# Altium footprint library 封装库.PcbLib: 755 footprints (part 38 of 48)
Each footprint in its own frame and in the unit in brackets; x right, y up, seen from the top. Pads: shape width x height; smd on the part's side, far side on the other; paste and mask are expansions set on the pad; w line width, h text height; cw(c..) or ccw(c..) is an arc to the next point about the centre after c.
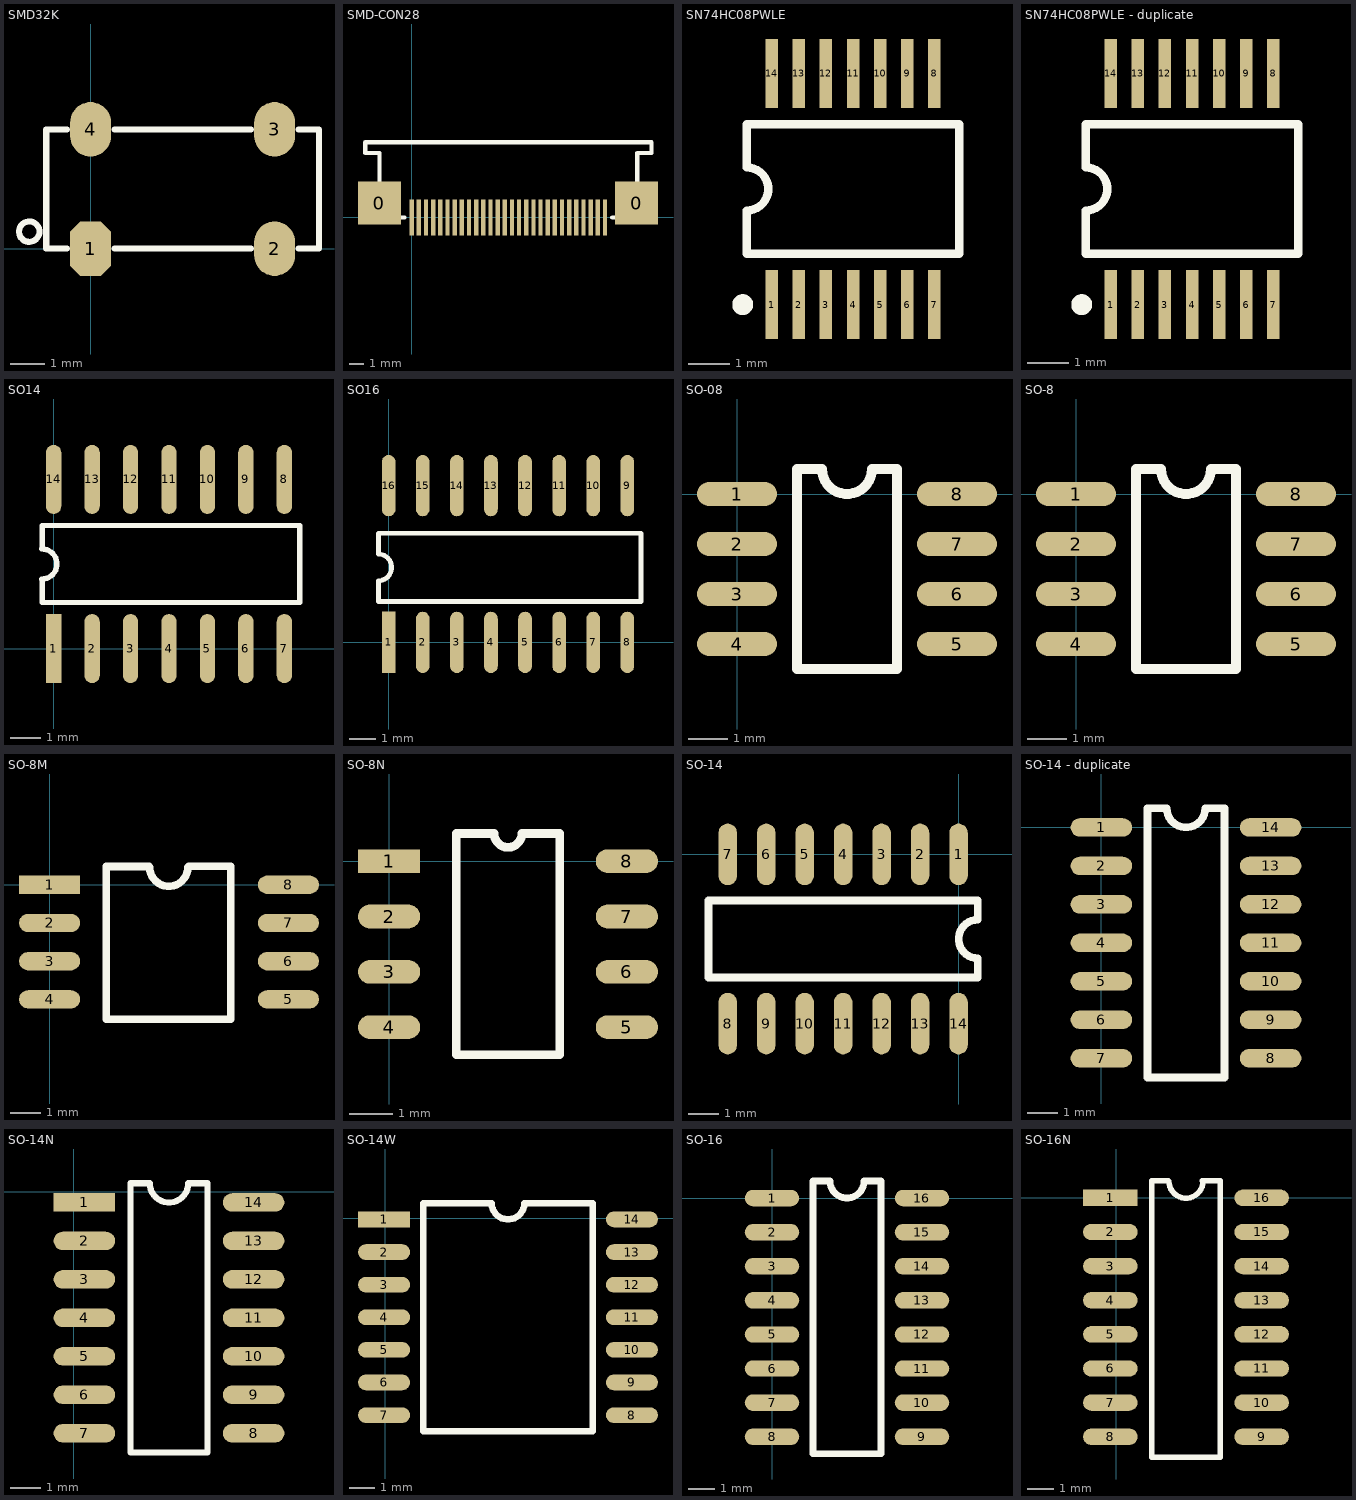
[diagram p37: the footprints below, top view; thin cyan lines are the x and y axes]

## SMD32K [mm]
pads (4):
  oct 1.2x1.6 smd: 1(-0.01,0)
  oval 1.2x1.6 smd: 2(5.39,0) 3(5.39,3.5) 4(-0.01,3.5)
Top Overlay:
  circle w0.178: c-1.81,0.5 r0.3
  lines w0.178: -0.71,0 -1.31,0 -1.31,3.5 -0.71,3.5 ; 0.69,0 4.69,0 ; 0.69,3.5 4.69,3.5 ; 6.09,0 6.69,0 6.69,3.5 6.09,3.5

## SMD-CON28 [mm]
pads (30):
  rect 3x3 smd: 0(-2.25,1) 0(15.7,1)
  rect 0.3x2.54 smd: 1(0,0) 2(0.5,0) 3(1,0) 4(1.5,0) 5(2,0) 6(2.5,0) 7(3,0) 8(3.5,0) 9(4,0) 10(4.5,0) 11(5,0) 12(5.5,0) 13(6,0) 14(6.5,0) 15(7,0) 16(7.5,0) 17(8,0) 18(8.5,0) 19(9,0) 20(9.5,0) 21(10,0) 22(10.5,0) 23(11,0) 24(11.5,0) 25(12,0) 26(12.5,0) 27(13,0) 28(13.5,0)
Top Overlay:
  lines w0.305: -0.5,0 -2.25,0 -2.25,4.5 -3.25,4.5 -3.25,5.25 -2.25,5.25 5.75,5.25 15.75,5.25 16.75,5.25 16.75,4.5 15.75,4.5 15.75,0 14,0 ; 2.25,5.25 9.5,5.25

## SN74HC08PWLE [mm]
pads (14):
  rect 0.3x1.65 smd: 1(-745.799,-810.4) 2(-745.149,-810.4) 3(-744.499,-810.4) 4(-743.849,-810.4) 5(-743.199,-810.4) 6(-742.549,-810.4) 7(-741.899,-810.4) 8(-741.899,-804.85) 9(-742.549,-804.85) 10(-743.199,-804.85) 11(-743.849,-804.85) 12(-744.499,-804.85) 13(-745.149,-804.85) 14(-745.799,-804.85)
Top Overlay:
  circle w0.25: c-746.499,-810.4 r0.125
  lines w0.2: -746.399,-809.175 -741.299,-809.175 -741.299,-806.075 -746.399,-806.075 -746.399,-807.108 cw(c-746.399,-807.625) -746.399,-808.142 -746.399,-809.175

## SN74HC08PWLE - duplicate [mm]
pads (14):
  rect 0.3x1.65 smd: 1(-745.799,-810.4) 2(-745.149,-810.4) 3(-744.499,-810.4) 4(-743.849,-810.4) 5(-743.199,-810.4) 6(-742.549,-810.4) 7(-741.899,-810.4) 8(-741.899,-804.85) 9(-742.549,-804.85) 10(-743.199,-804.85) 11(-743.849,-804.85) 12(-744.499,-804.85) 13(-745.149,-804.85) 14(-745.799,-804.85)
Top Overlay:
  circle w0.25: c-746.499,-810.4 r0.125
  lines w0.2: -746.399,-809.175 -741.299,-809.175 -741.299,-806.075 -746.399,-806.075 -746.399,-807.108 cw(c-746.399,-807.625) -746.399,-808.142 -746.399,-809.175

## SO14 [mil]
pads (14):
  rect 20x90 smd: 1(0,0)
  oval 20x90 smd: 2(50,0) 3(100,0) 4(150,0) 5(200,0) 6(250,0) 7(300,0) 8(300,220) 9(250,220) 10(200,220) 11(150,220) 12(100,220) 13(50,220) 14(0,220)
Top Overlay:
  lines w7: -15.35,90.31 ccw(c-15.35,110) -15.35,129.69 ; -15,90 -15,60 170,60 320,60 320,160 170,160 -15,160 -15,130

## SO16 [mil]
pads (16):
  rect 20x90 smd: 1(0,0)
  oval 20x90 smd: 2(50,0) 3(100,0) 4(150,0) 5(200,0) 6(250,0) 7(300,0) 8(350,0) 9(350,230) 10(300,230) 11(250,230) 12(200,230) 13(150,230) 14(100,230) 15(50,230) 16(0,230)
Top Overlay:
  lines w7: -15.35,90.31 ccw(c-15.35,110) -15.35,129.69 ; -15,90 -15,60 170,60 370,60 370,160 170,160 -15,160 -15,130

## SO-08 [mil]
pads (8):
  oval 80x24 smd: 1(0,0) 2(0,-50) 3(0,-100) 4(0,-150) 5(220,-150) 6(220,-100) 7(220,-50) 8(220,0)
Top Overlay:
  lines w10: 60,-175 60,25 85,25 ccw(c110,25) 135,25 160,25 160,-175 60,-175

## SO-8 [mil]
pads (8):
  oval 80x24 smd: 1(0,0) 2(0,-50) 3(0,-100) 4(0,-150) 5(220,-150) 6(220,-100) 7(220,-50) 8(220,0)
Top Overlay:
  lines w10: 60,-175 60,25 85,25 ccw(c110,25) 135,25 160,25 160,-175 60,-175

## SO-8M [mil]
pads (8):
  rect 80x24 smd: 1(0,0)
  oval 80x24 smd: 2(0,-50) 3(0,-100) 4(0,-150) 5(312.6,-150) 6(312.6,-100) 7(312.6,-50) 8(312.6,0)
Top Overlay:
  lines w10: 130.06,23.94 74.39,23.94 74.39,-176.06 237.01,-176.06 ; 131,23 ccw(c156,23) 181,23 ; 182,24 237.01,24 ; 236.01,23 237.01,24 ; 237.01,-176 237.01,24

## SO-8N [mm]
pads (8):
  rect 1.44x0.55 smd: 1(0,0)
  oval 1.44x0.55 smd: 2(0,-1.28) 3(0,-2.56) 4(0,-3.84) 5(5.5,-3.84) 6(5.5,-2.56) 7(5.5,-1.28) 8(5.5,0)
Top Overlay:
  lines w0.2: 1.555,-4.48 1.555,0.64 2.43,0.64 ccw(c2.75,0.64) 3.07,0.64 3.945,0.64 3.945,-4.48 1.555,-4.48

## SO-14 [mil]
pads (14):
  oval 24x80 smd: 1(-0.24,0.12) 2(-50.24,0.12) 3(-100.24,0.12) 4(-150.24,0.12) 5(-200.24,0.12) 6(-250.24,0.12) 7(-300.24,0.12) 8(-300.24,-219.88) 9(-250.24,-219.88) 10(-200.24,-219.88) 11(-150.24,-219.88) 12(-100.24,-219.88) 13(-50.24,-219.88) 14(-0.24,-219.88)
Top Overlay:
  lines w10: -325.24,-159.88 24.76,-159.88 24.76,-134.88 cw(c24.76,-109.88) 24.76,-84.88 24.76,-59.88 -325.24,-59.88 -325.24,-159.88

## SO-14 - duplicate [mil]
pads (14):
  oval 80x24 smd: 1(0,0) 2(0,-50) 3(0,-100) 4(0,-150) 5(0,-200) 6(0,-250) 7(0,-300) 8(220,-300) 9(220,-250) 10(220,-200) 11(220,-150) 12(220,-100) 13(220,-50) 14(220,0)
Top Overlay:
  lines w10: 60,-325 160,-325 160,25 135,25 cw(c110,25) 85,25 60,25 60,-325

## SO-14N [mil]
pads (14):
  rect 80x24 smd: 1(14,-14)
  oval 80x24 smd: 2(14,-64) 3(14,-114) 4(14,-164) 5(14,-214) 6(14,-264) 7(14,-314) 8(234,-314) 9(234,-264) 10(234,-214) 11(234,-164) 12(234,-114) 13(234,-64) 14(234,-14)
Top Overlay:
  lines w8: 74,-339 74,11 99,11 ccw(c124,11) 149,11 174,11 174,-339 74,-339

## SO-14W [mil]
pads (14):
  rect 80x24 smd: 1(-2,-2)
  oval 80x24 smd: 2(-2,-52) 3(-2,-102) 4(-2,-152) 5(-2,-202) 6(-2,-252) 7(-2,-302) 8(378,-302) 9(378,-252) 10(378,-202) 11(378,-152) 12(378,-102) 13(378,-52) 14(378,-2)
Top Overlay:
  lines w10: 58,-327 58,23 163,23 ccw(c188,23) 213,23 318,23 318,-327 58,-327

## SO-16 [mil]
pads (16):
  oval 80x24 smd: 1(0,0) 2(0,-50) 3(0,-100) 4(0,-150) 5(0,-200) 6(0,-250) 7(0,-300) 8(0,-350) 9(220,-350) 10(220,-300) 11(220,-250) 12(220,-200) 13(220,-150) 14(220,-100) 15(220,-50) 16(220,0)
Top Overlay:
  lines w10: 60,-375 60,25 85,25 ccw(c110,25) 135,25 160,25 160,-375 60,-375

## SO-16N [mil]
pads (16):
  rect 80x24 smd: 1(-9,0.1)
  oval 80x24 smd: 2(-9,-49.9) 3(-9,-99.9) 4(-9,-149.9) 5(-9,-199.9) 6(-9,-249.9) 7(-9,-299.9) 8(-9,-349.9) 9(212.9,-349.9) 10(212.9,-299.9) 11(212.9,-249.9) 12(212.9,-199.9) 13(212.9,-149.9) 14(212.9,-99.9) 15(212.9,-49.9) 16(212.9,0.1)
Top Overlay:
  lines w8: 51.9,24.72 51.9,-379.9 151.9,-379.9 151.9,24.72 ; 51.9,25.1 76,25.1 ; 76.9,24.72 ccw(c101.9,24.72) 126.9,24.72 ; 126,25.1 151.9,25.1